# Altium footprint library connectors.PcbLib: 256 footprints (part 1 of 16)
Each footprint in its own frame and in the unit in brackets; x right, y up, seen from the top. Pads: shape width x height; smd on the part's side, far side on the other; paste and mask are expansions set on the pad; w line width, h text height; cw(c..) or ccw(c..) is an arc to the next point about the centre after c.
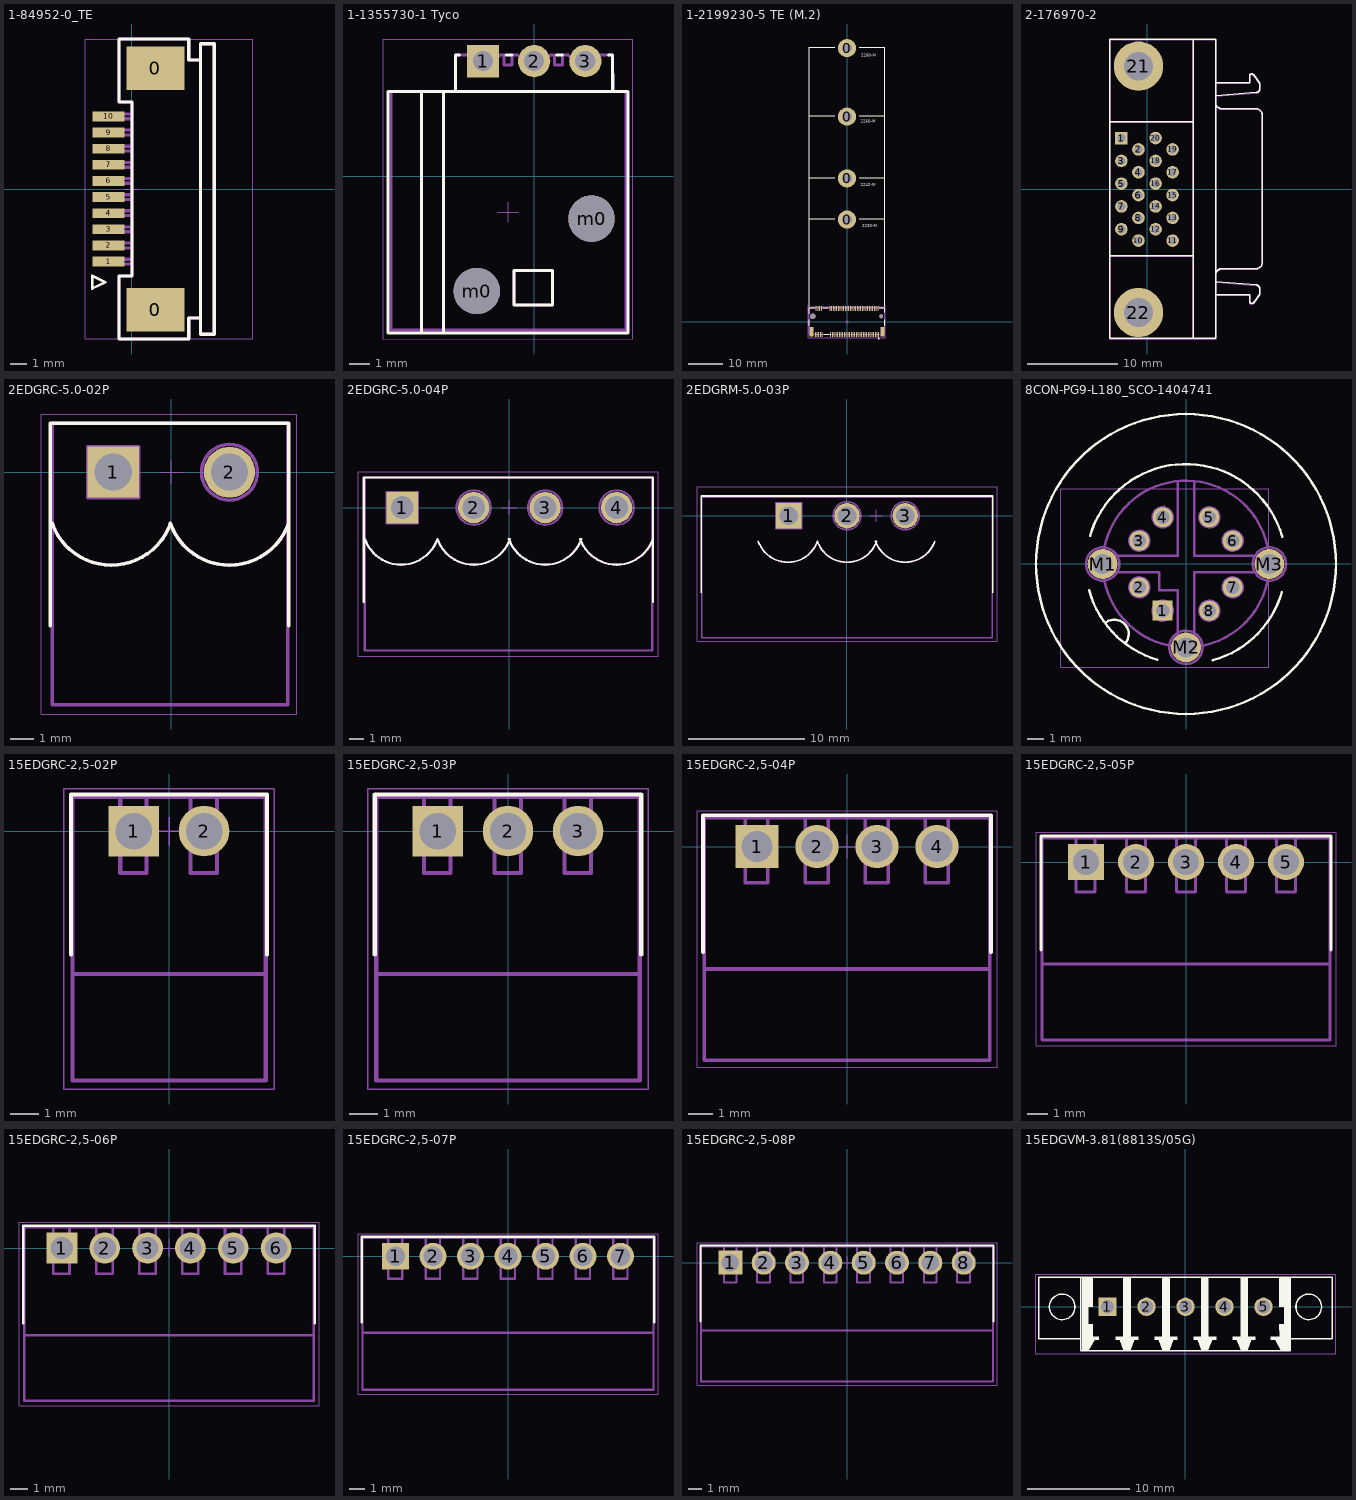
[diagram p0: the footprints below, top view; thin cyan lines are the x and y axes]

## 1-84952-0_TE [mm] "FPC_10pin_1mm_Pitch_SMD_Right Angle"
height 2.6
pads (12):
  rect 3.6x2.68 smd: 0(1.45,7.49) 0(1.45,-7.49)
  rect 2x0.61 smd: 1(-1.45,-4.5) 2(-1.45,-3.5) 3(-1.45,-2.5) 4(-1.45,-1.5) 5(-1.45,-0.5) 6(-1.45,0.5) 7(-1.45,1.5) 8(-1.45,2.5) 9(-1.45,3.5) 10(-1.45,4.5)
Top Overlay:
  lines w0.15: -2.45,-6.175 -2.45,-5.375 -1.65,-5.775 -2.45,-6.175
  lines w0.2: 3.523,-9.3 -0.799,-9.3 -0.799,-5.399 0,-5.399 0,5.399 -0.799,5.399 -0.799,9.3 3.523,9.3 3.525,9.298 3.525,8 4.25,8 ; 3.525,-9.298 3.525,-8 4.25,-8 ; 4.25,8 4.25,9 5.1,9 5.1,-9 4.25,-9 4.25,8
TopAssy 13:
  lines w0.15: -2.45,-6.175 -2.45,-5.375 -1.65,-5.775 -2.45,-6.175 ; -0.092,6.931 -0.092,8.506 2.958,8.506 2.958,6.931 -0.092,6.931 ; -0.058,-8.506 -0.058,-6.931 2.992,-6.931 2.992,-8.506 -0.058,-8.506
  lines w0.2: -0.05,-4.65 -2,-4.65 -2,-4.35 -0.05,-4.35 ; -0.05,-3.65 -2,-3.65 -2,-3.35 -0.05,-3.35 ; -0.05,-2.65 -2,-2.65 -2,-2.35 -0.05,-2.35 ; -0.05,-1.65 -2,-1.65 -2,-1.35 -0.05,-1.35 ; -0.05,-0.65 -2,-0.65 -2,-0.35 -0.05,-0.35 ; -0.05,0.35 -2,0.35 -2,0.65 -0.05,0.65 ; -0.05,1.35 -2,1.35 -2,1.65 -0.05,1.65 ; -0.05,2.35 -2,2.35 -2,2.65 -0.05,2.65 ; -0.05,3.35 -2,3.35 -2,3.65 -0.05,3.65 ; -0.05,4.35 -2,4.35 -2,4.65 -0.05,4.65 ; 3.523,-9.3 -0.799,-9.3 -0.799,-5.399 0,-5.399 0,5.399 -0.799,5.399 -0.799,9.3 3.523,9.3 3.525,9.298 3.525,8 4.25,8 ; 3.525,-9.298 3.525,-8 4.25,-8 ; 4.25,8 4.25,-9 5.1,-9 5.1,9 4.25,9 4.25,8
TopCourt 15:
  lines w0.05: -0.5,0 0.5,0 ; 0,-0.5 0,0.5 ; -2.9,-9.3 7.5,-9.3 7.5,9.3 -2.9,9.3 -2.9,-9.3
3D body "c-1-84952-0-a-3d.stp": height 2.57, standoff 0.01, extent -1.445,-8.96 5.095,8.95

## 1-1355730-1 Tyco [mm] "MW-3M (Through Hole, Right Angle Pitch  0.100\" (2.54mm)"
height 11.4
pads (5):
  rect 1.6x1.6 hole 1: 1(-2.54,5.71)
  round 1.6 hole 1: 2(0,5.71) 3(2.54,5.71)
  round 2.3 hole 2.3 unplated: m0(-2.85,-5.71) m0(2.85,-2.11)
Top Overlay:
  lines w0.15: -5.601,4.21 -5.599,-7.69 ; -4.5,-7.79 -4.5,4.21 ; -3.908,4.209 -3.896,6.01 -3.7,6.01 ; -1.4,6.01 -1.1,6.01 ; 1.1,6.01 1.4,6.01 ; 3.7,6.01 3.89,6.01 3.903,4.209 ; -7.25,-7.79 4.65,-7.79 4.65,4.21 -7.25,4.21 -7.25,-7.79 ; -1,-6.39 0.9,-6.39 0.9,-4.69 -1,-4.69 -1,-6.39
  text "." at -4,6.81 h1.52
TopAssy 13:
  circle w0.15: c-2.85,-5.71 r1.044
  circle w0.15: c2.85,-2.11 r1.044
  lines w0.15: -5.6,-7.64 -5.6,4.21 ; -4.5,-7.64 -4.5,4.21 ; -3.9,4.21 -3.9,6.01 -3.3,6.01 -2.7,5.51 ; 4.003,4.21 -7.1,4.21 -7.1,-7.64 4.55,-7.64 4.55,4.21 3.9,4.21 3.9,6.01 3.3,6.01 2.7,5.51 ; -2.7,5.51 -2.3,5.51 ; -2.7,5.51 -2.7,6.01 -2.3,6.01 -2.3,5.51 ; -2.3,5.51 -1.7,6.01 -1.5,6.01 -1.5,5.51 -1.1,5.51 -1.1,6.01 -0.8,6.01 -0.2,5.51 ; -0.2,5.51 0.2,5.51 ; -0.2,5.51 -0.2,6.01 0.2,6.01 0.2,5.51 ; 0.2,5.51 0.8,6.01 1,6.01 1,5.51 1.4,5.51 1.4,6.01 1.7,6.01 2.3,5.51 ; 2.3,5.51 2.3,6.01 2.7,6.01 2.7,5.51 ; 2.3,5.51 2.7,5.51 ; -1,-6.39 -1,-4.69 0.9,-4.69 0.9,-6.39 -1,-6.39
TopCourt 15:
  lines w0.05: -1.8,-1.79 -0.8,-1.79 ; -1.3,-2.29 -1.3,-1.29 ; -7.5,-8.09 -7.5,6.81 4.9,6.81 4.9,-8.09 -7.5,-8.09
3D body "c-1-1355730-1-d2-3d.stp": height 5.91, standoff -2.59, extent -7.1,-7.71 4.6,6.01

## 1-2199230-5 TE (M.2) [mm] "M.2 0.5PITCH 4.2H KEY M 15U'' AU"
pads (75):
  round 5.3 hole 3 unplated: 0(0,29.75) 0(0,41.75) 0(0,59.75) 0(0,79.75)
  rect 0.3x1.55 smd mask+0.05: 1(9.25,-3.775) 2(9,3.775) 3(8.75,-3.775) 4(8.5,3.775) 5(8.25,-3.775) 6(8,3.775) 7(7.75,-3.775) 8(7.5,3.775) 9(7.25,-3.775) 10(7,3.775) 11(6.75,-3.775) 12(6.5,3.775) 13(6.25,-3.775) 14(6,3.775) 15(5.75,-3.775) 16(5.5,3.775) 17(5.25,-3.775) 18(5,3.775) 19(4.75,-3.775) 20(4.5,3.775) 21(4.25,-3.775) 22(4,3.775) 23(3.75,-3.775) 24(3.5,3.775) 25(3.25,-3.775) 26(3,3.775) 27(2.75,-3.775) 28(2.5,3.775) 29(2.25,-3.775) 30(2,3.775) 31(1.75,-3.775) 32(1.5,3.775) 33(1.25,-3.775) 34(1,3.775) 35(0.75,-3.775) 36(0.5,3.775) 37(0.25,-3.775) 38(0,3.775) 39(-0.25,-3.775) 40(-0.5,3.775) 41(-0.75,-3.775) 42(-1,3.775) 43(-1.25,-3.775) 44(-1.5,3.775) 45(-1.75,-3.775) 46(-2,3.775) 47(-2.25,-3.775) 48(-2.5,3.775) 49(-2.75,-3.775) 50(-3,3.775) 51(-3.25,-3.775) 52(-3.5,3.775) 53(-3.75,-3.775) 54(-4,3.775) 55(-4.25,-3.775) 56(-4.5,3.775) 57(-4.75,-3.775) 58(-5,3.775) 67(-7.25,-3.775) 68(-7.5,3.775) 69(-7.75,-3.775) 70(-8,3.775) 71(-8.25,-3.775) 72(-8.5,3.775) 73(-8.75,-3.775) 74(-9,3.775) 75(-9.25,-3.775)
  round 1.6 hole 1.6 unplated: None(-10,1.5)
  round 1.1 hole 1.1 unplated: None(10,1.5)
  rect 1.2x2.75 smd: S1(10.35,-3) S2(-10.35,-3)
Top Overlay:
  circle w0.2: c9.25,-5 r0.1
  lines w0.127: -10.95,-1.3 -10.95,0.45 ; -10.95,2.3 -10.95,4 -9.45,4 ; -7.1,4 -5.4,4 ; -6.8,-3.75 -5.2,-3.75 ; 9.4,4 10.95,4 10.95,2.7 ; 10.95,-1.3 10.95,0.55
  lines w0.15: -11,4.5 -11,60 ; -11,30 -3.5,30 ; -11,42 -3.5,42 ; -3.5,60 -11,60 ; -3.5,80 -11,80 -11,60 ; 3.5,30 11,30 ; 3.5,42 11,42 ; 3.5,60 11,60 ; 3.5,80 11,80 11,60 ; 11,4.5 11,60
  text "2280-M" at 4.1,77.2 h0.85
  text "2230-M" at 4.5,27.5 h0.85
  text "2242-M" at 4,39.5 h0.85
  text "2260-M" at 4,58 h0.85
TopAssy 13:
  lines w0.127: -10.95,-3.75 -10.95,4 ; -10.95,-3.75 10.95,-3.75 ; -10.95,-3.75 -10.95,4 ; -10.95,-3.75 10.95,-3.75 ; -10.95,4 10.95,4 ; -10.95,4 10.95,4 ; 10.95,-3.75 10.95,4 ; 10.95,-3.75 10.95,4
TopCourt 15:
  lines w0.05: -11.25,4.3 11.2,4.3 ; -11.25,4.8 -11.25,-4.8 11.2,-4.8 11.2,4.8 ; -0.5,0 0.5,0 ; 0,-0.5 0,0.5
3D body "9774025243R.stp": height 2.51, standoff -1.39, extent -2.175,77.576 2.175,81.925
3D body "c-1-2199230-5-b2-3d.stp": height 4.06, standoff -0.64, extent -10.95,-4.35 10.95,4.35

## 2-176970-2 [mm] "Connector; CHAMP Miniature Ribbon 050 Series II; 20 Position; Right Angle"
height 9.6
pads (22):
  rect 1.4x1.4 hole 0.9: 1(-2.857,5.715)
  round 1.4 hole 0.9: 2(-0.953,4.445) 3(-2.858,3.175) 4(-0.953,1.905) 5(-2.857,0.635) 6(-0.953,-0.635) 7(-2.857,-1.905) 8(-0.953,-3.175) 9(-2.857,-4.445) 10(-0.953,-5.715) 11(2.857,-5.715) 12(0.953,-4.445) 13(2.858,-3.175) 14(0.953,-1.905) 15(2.857,-0.635) 16(0.953,0.635) 17(2.857,1.905) 18(0.953,3.175) 19(2.857,4.445) 20(0.953,5.715)
  round 5.5 hole 3.2: 21(-0.953,13.725) 22(-0.953,-13.725)
Top Overlay:
  lines w0.15: -4.157,-7.4 5.142,-7.4 ; -4.157,7.55 5.062,7.55 ; 5.142,-16.6 5.142,16.75 ; 7.642,-11.745 11.432,-11.745 11.433,-12.625 ccw(c11.652,-12.375) 11.897,-12.601 ; 7.642,-10.275 12.163,-10.645 ; 7.642,10.425 12.163,10.795 ; 7.642,11.895 11.432,11.895 11.433,12.775 cw(c11.652,12.525) 11.897,12.751 ; 7.648,-9.535 cw(c8.343,-9.535) 8.343,-8.84 12.143,-8.84 ; 7.648,9.685 ccw(c8.343,9.685) 8.343,8.99 12.143,8.99 ; 11.912,-12.615 12.54,-11.675 12.54,-10.953 ccw(c12.143,-11.055) 12.143,-10.645 ; 11.912,12.765 12.54,11.825 12.54,11.103 cw(c12.143,11.205) 12.143,10.795 ; 12.148,-8.835 ccw(c12.148,-8.14) 12.843,-8.14 12.842,8.29 ccw(c12.148,8.29) 12.148,8.985 ; -4.157,-16.6 7.642,-16.6 7.642,16.75 -4.157,16.75 -4.157,-16.6
Bottom3D 2:
  text "11" at 5.617,-4.84 h1.5
  text "20" at 5.617,6.965 h1.5
  text "10" at -6.132,-4.59 h1.5
  text "1" at -6.132,5.965 h1.5
TopAssy 13:
  circle w0.15: c-0.953,13.7 r1.65
  circle w0.15: c-0.953,-13.75 r1.65
  lines w0.15: -4.157,-7.475 5.142,-7.475 ; -4.157,7.475 5.062,7.475 ; 5.142,-16.675 5.142,16.675 ; 7.642,-11.82 11.432,-11.82 11.433,-12.7 ccw(c11.652,-12.45) 11.897,-12.676 ; 7.642,-10.35 12.163,-10.72 ; 7.642,10.35 12.163,10.72 ; 7.642,11.82 11.432,11.82 11.433,12.7 cw(c11.652,12.45) 11.897,12.676 ; 7.648,-9.61 cw(c8.343,-9.61) 8.343,-8.915 12.143,-8.915 ; 7.648,9.61 ccw(c8.343,9.61) 8.343,8.915 12.143,8.915 ; 11.912,-12.69 12.54,-11.75 12.54,-11.028 ccw(c12.143,-11.13) 12.143,-10.72 ; 11.912,12.69 12.54,11.75 12.54,11.028 cw(c12.143,11.13) 12.143,10.72 ; 12.148,-8.91 ccw(c12.148,-8.215) 12.843,-8.215 12.842,8.215 ccw(c12.148,8.215) 12.148,8.91 ; -4.157,-16.675 -4.157,16.675 7.642,16.675 7.642,-16.675 -4.157,-16.675

## 2EDGRC-5.0-02P [mm] "Разъем на плату, шаг 5.0, вилка 2EDGRC-5.0-02P"
height 12
pads (2):
  rect 2.2x2.2 hole 1.6: 1(-2.5,0)
  round 2.2 hole 1.6: 2(2.5,0)
Top Overlay:
  lines w0.15: -5.2,-6.6 -5.2,2.1 5.04,2.1 5.04,-6.6 ; -5.125,-2.202 ccw(c-2.58,-1.3) -0.036,-2.205 ; -0.045,-2.202 ccw(c2.5,-1.3) 5.045,-2.202
  text "." at -2.58,2.395 h1.52
TopAssy 13:
  circle w0.15: c2.5,0 r1.2
  lines w0.15: -5.125,-2.202 ccw(c-2.58,-1.3) -0.036,-2.205 ; -0.045,-2.202 ccw(c2.5,-1.3) 5,-2.32 ; -5.125,-10 5,-10 5,2.1 -5.125,2.1 -5.125,-10 ; -3.6,-1.1 -1.4,-1.1 -1.4,1.1 -3.6,1.1 -3.6,-1.1
  text "." at -2.58,2.395 h1.52
TopCourt 15:
  lines w0.05: -0.5,-0.001 0.5,-0.001 ; 0,-0.501 0,0.499 ; -5.6,-10.4 -5.6,2.5 5.4,2.5 5.4,-10.4 -5.6,-10.4
3D body "2EDGRC-5.08-02P-14-00AH_.step": height 8.25, standoff -3.95, extent -5.12,-10 5.04,2.1

## 2EDGRC-5.0-04P [mm] "Разъем на плату, шаг 5.0, вилка 2EDGRC-5.0-04P"
height 12
pads (4):
  rect 2.2x2.2 hole 1.6: 1(-7.5,0)
  round 2.2 hole 1.6: 2(-2.5,0) 3(2.5,0) 4(7.5,0)
Top Overlay:
  lines w0.15: -10.2,-6.6 -10.2,2.1 10.04,2.1 10.04,-6.6 ; -10.125,-2.202 ccw(c-7.58,-1.3) -5.036,-2.205 ; -5.045,-2.202 ccw(c-2.5,-1.3) 0.045,-2.202 ; -0.045,-2.202 ccw(c2.5,-1.3) 5.045,-2.202 ; 4.955,-2.202 ccw(c7.5,-1.3) 10.045,-2.202
  text "." at -7.58,2.395 h1.52
TopAssy 13:
  circle w0.15: c7.5,0 r1.2
  circle w0.15: c2.5,0 r1.2
  circle w0.15: c-2.5,0 r1.2
  lines w0.15: -10.125,-2.202 ccw(c-7.58,-1.3) -5.036,-2.205 ; -5.045,-2.202 ccw(c-2.5,-1.3) 0,-2.32 ; -0.045,-2.202 ccw(c2.5,-1.3) 5,-2.32 ; 4.955,-2.202 ccw(c7.5,-1.3) 10,-2.32 ; -10.125,-10 -10.125,2.1 10,2.1 10,-10 -10.125,-10 ; -8.6,-1.1 -8.6,1.1 -6.4,1.1 -6.4,-1.1 -8.6,-1.1
  text "." at -7.58,2.395 h1.52
TopCourt 15:
  lines w0.05: -0.5,-0.001 0.5,-0.001 ; 0,-0.501 0,0.499 ; -10.6,-10.4 10.4,-10.4 10.4,2.5 -10.6,2.5 -10.6,-10.4
3D body "2EDGRC-5.08-02P-14-00AH_.step": height 8.25, standoff -3.95, extent -10.12,-10 0.04,2.1
3D body "2EDGRC-5.08-02P-14-00AH_.step": height 8.25, standoff -3.95, extent -0.12,-10 10.04,2.1

## 2EDGRM-5.0-03P [mm] "Разъем на плату 3 контакта, шаг 5.0, вилка 2EDGRM-5.0-03P-14-00A(H)"
height 8.2
pads (3):
  rect 2.2x2.2 hole 1.6: 1(-5,0)
  round 2.2 hole 1.6: 2(0,0) 3(5,0)
Top Overlay:
  lines w0.15: -12.54,-6.6 -12.54,1.691 12.54,1.691 12.54,-6.6 ; -7.625,-2.202 ccw(c-5.08,-1.3) -2.536,-2.205 ; -2.545,-2.202 ccw(c0,-1.3) 2.545,-2.202 ; 2.455,-2.202 ccw(c5,-1.3) 7.545,-2.202
  text "." at -5.08,2.395 h1.52
TopAssy 13:
  circle w0.15: c0,0 r1.2
  circle w0.15: c5,0 r1.2
  lines w0.15: -7.625,-2.202 ccw(c-5.08,-1.3) -2.536,-2.205 ; -2.545,-2.202 ccw(c0,-1.3) 2.5,-2.32 ; 2.455,-2.202 ccw(c5,-1.3) 7.5,-2.32 ; -12.5,-10.5 12.5,-10.5 12.5,1.6 -12.5,1.6 -12.5,-10.5 ; -6.1,-1.1 -3.9,-1.1 -3.9,1.1 -6.1,1.1 -6.1,-1.1
  text "." at -5.08,2.395 h1.52
TopCourt 15:
  lines w0.05: 2,-0.001 3,-0.001 ; 2.5,-0.501 2.5,0.499 ; -12.9,-10.8 -12.9,2.5 12.9,2.5 12.9,-10.8 -12.9,-10.8
3D body "2EDGRM-5.0-03P-14-00AH.STEP": height 8.25, standoff -3.95, extent -12.5,-10.5 12.5,1.6

## 8CON-PG9-L180_SCO-1404741 [mm] "Разъем на плату, вилка 8 контактов 10Gbit"
height 23
pads (11):
  rect 1.2x1.2 hole 0.8: 1(-1.4,-2.8)
  round 1.2 hole 0.8: 2(-2.8,-1.4) 3(-2.8,1.4) 4(-1.4,2.8) 5(1.4,2.8) 6(2.8,1.4) 7(2.8,-1.4) 8(1.4,-2.8)
  round 1.8 hole 1.2: M1(-5,0) M2(0,-5) M3(5,0)
Top Overlay:
  circle w0.15: c0,0 r9
  lines w0.15: -5.816,-1.583 ccw(c-0.033,0.017) -1.718,-5.742 ; -5.758,1.685 cw(c0,0) 5.77,1.644 ; -4.777,-3.484 cw(c-4.3,-4.2) -3.647,-4.76 ; 1.6,-5.783 ccw(c0,0) 5.758,-1.686
  text "." at -2.5,-4 h1.52
TopAssy 13:
  circle w0.15: c-1.4,-2.8 r0.6
  circle w0.15: c0,-5 r1
  circle w0.15: c-5,0 r1
  circle w0.15: c5,0 r1
  circle w0.15: c-2.8,1.4 r0.6
  circle w0.15: c-2.8,-1.4 r0.6
  circle w0.15: c1.4,-2.8 r0.6
  circle w0.15: c2.8,-1.4 r0.6
  circle w0.15: c2.8,1.4 r0.6
  circle w0.15: c1.4,2.8 r0.6
  circle w0.15: c-1.4,2.8 r0.6
  circle w0.15: c0,0 r5
  lines w0.15: -4.97,-0.5 -1.606,-0.5 -1.606,-1.583 -0.5,-1.583 -0.5,-4.97 ; -4.97,0.5 -0.5,0.5 -0.5,4.97 ; 0.5,-4.97 0.5,-0.5 4.969,-0.5 ; 0.5,4.97 0.5,0.5 4.969,0.5
TopCourt 15:
  lines w0.05: -1.78,3.018 -0.78,3.018 ; -1.28,2.518 -1.28,3.518 ; -7.53,-6.182 4.97,-6.182 4.97,4.518 -7.53,4.518 -7.53,-6.182
3D body "1404741.stp": height 22.46, standoff -2.39, extent -9,-9.997 9,9.997

## 15EDGRC-2,5-02P [mm] "Разъем на плату, вилка DAGSON угловая"
height 9.2
pads (2):
  rect 1.8x1.8 hole 1.3: 1(-1.25,0)
  round 1.8 hole 1.3: 2(1.25,0)
Top Overlay:
  lines w0.15: -3.5,-4.4 -3.5,1.3 3.5,1.3 3.5,-4.4
  text "." at -2.7,1.9 h1.52
TopAssy 13:
  circle w0.15: c1.25,0 r0.6
  circle w0.15: c-1.25,0 r0.6
  lines w0.15: -3.446,-5.1 3.448,-5.1 ; -2,1.212 -1.741,1.212 -1.741,-1.5 -0.803,-1.5 -0.803,1.212 ; 0.766,1.212 0.766,-1.5 1.715,-1.5 1.715,1.212 ; -3.446,-8.9 3.448,-8.9 3.448,1.212 -3.446,1.212 -3.446,-8.9
TopCourt 15:
  lines w0.05: -0.5,0 0.5,0 ; 0,-0.5 0,0.5 ; -3.75,-9.2 -3.75,1.5 3.75,1.5 3.75,-9.2 -3.75,-9.2
3D body "User Library-15EDGRC-2_5-02P-1Y-00A (H).step": height 8.15, standoff -3.75, extent -3.45,-8.9 3.45,1.2

## 15EDGRC-2,5-03P [mm] "Разъем на плату, вилка DAGSON угловая"
height 9.2
pads (3):
  rect 1.8x1.8 hole 1.3: 1(-2.5,0)
  round 1.8 hole 1.3: 2(0,0) 3(2.5,0)
Top Overlay:
  lines w0.15: -4.75,-4.4 -4.75,1.3 4.75,1.3 4.75,-4.4
  text "." at -3.95,1.9 h1.52
TopAssy 13:
  circle w0.15: c0,0 r0.6
  circle w0.15: c-2.5,0 r0.6
  circle w0.15: c2.5,0 r0.6
  lines w0.15: -4.696,-5.1 4.698,-5.1 ; -3.25,1.212 -2.991,1.212 -2.991,-1.5 -2.053,-1.5 -2.053,1.212 ; -0.484,1.212 -0.484,-1.5 0.465,-1.5 0.465,1.212 ; 2.016,1.212 2.016,-1.5 2.965,-1.5 2.965,1.212 ; -4.696,-8.9 4.698,-8.9 4.698,1.212 -4.696,1.212 -4.696,-8.9
TopCourt 15:
  lines w0.05: -0.5,0 0.5,0 ; 0,-0.5 0,0.5 ; -5,-9.2 -5,1.5 5,1.5 5,-9.2 -5,-9.2
3D body "User Library-15EDGRC-2_5-03P-1Y-00A (H).step": height 8.15, standoff -3.75, extent -4.7,-8.9 4.7,1.2

## 15EDGRC-2,5-04P [mm] "Разъем на плату, вилка DAGSON угловая"
height 9.2
pads (4):
  rect 1.8x1.8 hole 1.3: 1(-3.75,0)
  round 1.8 hole 1.3: 2(-1.25,0) 3(1.25,0) 4(3.75,0)
Top Overlay:
  lines w0.15: -6,-4.4 -6,1.3 6,1.3 6,-4.4
  text "." at -5.2,1.9 h1.52
TopAssy 13:
  circle w0.15: c-3.75,0 r0.6
  circle w0.15: c-1.25,0 r0.6
  circle w0.15: c1.25,0 r0.6
  circle w0.15: c3.75,0 r0.6
  lines w0.15: -5.946,-5.1 5.948,-5.1 ; -4.5,1.212 -4.241,1.212 -4.241,-1.5 -3.303,-1.5 -3.303,1.212 ; -1.734,1.212 -1.734,-1.5 -0.785,-1.5 -0.785,1.212 ; 0.766,1.212 0.766,-1.5 1.715,-1.5 1.715,1.212 ; 3.266,1.212 3.266,-1.5 4.215,-1.5 4.215,1.212 ; 5.948,-8.9 5.948,1.212 -5.946,1.212 -5.946,-8.9 5.95,-8.9
TopCourt 15:
  lines w0.05: -0.5,0 0.5,0 ; 0,-0.5 0,0.5 ; -6.25,-9.2 6.25,-9.2 6.25,1.5 -6.25,1.5 -6.25,-9.2
3D body "User Library-15EDGRC-2_5-04P-1Y-00A (H).step": height 8.15, standoff -3.75, extent -5.95,-8.9 5.95,1.2

## 15EDGRC-2,5-05P [mm] "Разъем на плату, вилка DAGSON угловая"
height 9.2
pads (5):
  rect 1.8x1.8 hole 1.3: 1(-5,0)
  round 1.8 hole 1.3: 2(-2.5,0) 3(0,0) 4(2.5,0) 5(5,0)
Top Overlay:
  lines w0.15: -7.25,-4.4 -7.25,1.3 7.25,1.3 7.25,-4.4
  text "." at -6.45,1.9 h1.52
TopAssy 13:
  circle w0.15: c-2.5,0 r0.6
  circle w0.15: c-5,0 r0.6
  circle w0.15: c0,0 r0.6
  circle w0.15: c2.5,0 r0.6
  circle w0.15: c5,0 r0.6
  lines w0.15: -7.196,-5.1 7.2,-5.1 ; -5.75,1.212 -5.491,1.212 -5.491,-1.5 -4.553,-1.5 -4.553,1.212 ; -2.984,1.212 -2.984,-1.5 -2.035,-1.5 -2.035,1.212 ; -0.484,1.212 -0.484,-1.5 0.465,-1.5 0.465,1.212 ; 2.016,1.212 2.016,-1.5 2.965,-1.5 2.965,1.212 ; 4.516,1.212 4.516,-1.5 5.465,-1.5 5.465,1.212 ; -7.196,-8.9 7.198,-8.9 7.198,1.212 -7.196,1.212 -7.196,-8.9
TopCourt 15:
  lines w0.05: -0.5,0 0.5,0 ; 7.5,-0.5 7.5,0.5 ; -7.5,-9.2 -7.5,1.5 7.5,1.5 7.5,-9.2 -7.5,-9.2
3D body "User Library-15EDGRC-2_5-05P-1Y-00A (H).step": height 8.15, standoff -3.75, extent -7.2,-8.9 7.2,1.2

## 15EDGRC-2,5-06P [mm] "Разъем на плату, вилка DAGSON угловая"
height 9.2
pads (6):
  rect 1.8x1.8 hole 1.3: 1(-6.25,0)
  round 1.8 hole 1.3: 2(-3.75,0) 3(-1.25,0) 4(1.25,0) 5(3.75,0) 6(6.25,0)
Top Overlay:
  lines w0.15: -8.5,-4.4 -8.5,1.3 8.5,1.3 8.5,-4.4
  text "." at -7.7,1.9 h1.52
TopAssy 13:
  circle w0.15: c6.25,0 r0.6
  circle w0.15: c3.75,0 r0.6
  circle w0.15: c1.25,0 r0.6
  circle w0.15: c-1.25,0 r0.6
  circle w0.15: c-6.25,0 r0.6
  circle w0.15: c-3.75,0 r0.6
  lines w0.15: -8.446,-5.1 8.448,-5.1 ; -7,1.212 -6.741,1.212 -6.741,-1.5 -5.803,-1.5 -5.803,1.212 ; -4.234,1.212 -4.234,-1.5 -3.285,-1.5 -3.285,1.212 ; -1.734,1.212 -1.734,-1.5 -0.785,-1.5 -0.785,1.212 ; 0.766,1.212 0.766,-1.5 1.715,-1.5 1.715,1.212 ; 3.266,1.212 3.266,-1.5 4.215,-1.5 4.215,1.212 ; 5.766,1.212 5.766,-1.5 6.715,-1.5 6.715,1.212 ; 8.448,1.212 8.448,-8.9 -8.446,-8.9 -8.446,1.212 8.45,1.212
TopCourt 15:
  lines w0.05: -0.5,0 0.5,0 ; 0,-0.5 0,0.5 ; 8.75,-0.5 8.75,0.5 ; -8.75,-9.2 8.75,-9.2 8.75,1.5 -8.75,1.5 -8.75,-9.2
3D body "User Library-15EDGRC-2_5-06P-1Y-00A (H).step": height 8.15, standoff -3.75, extent -8.45,-8.9 8.45,1.2

## 15EDGRC-2,5-07P [mm] "Разъем на плату, вилка DAGSON угловая"
height 9.2
pads (7):
  rect 1.8x1.8 hole 1.3: 1(-7.5,0)
  round 1.8 hole 1.3: 2(-5,0) 3(-2.5,0) 4(0,0) 5(2.5,0) 6(5,0) 7(7.5,0)
Top Overlay:
  lines w0.15: -9.75,-4.4 -9.75,1.3 9.75,1.3 9.75,-4.4
  text "." at -8.95,1.9 h1.52
TopAssy 13:
  circle w0.15: c7.5,0 r0.6
  circle w0.15: c5,0 r0.6
  circle w0.15: c2.5,0 r0.6
  circle w0.15: c0,0 r0.6
  circle w0.15: c-2.5,0 r0.6
  circle w0.15: c-5,0 r0.6
  circle w0.15: c-7.5,0 r0.6
  lines w0.15: -9.696,-5.1 9.7,-5.1 ; -8.25,1.212 -7.991,1.212 -7.991,-1.5 -7.053,-1.5 -7.053,1.212 ; -5.484,1.212 -5.484,-1.5 -4.535,-1.5 -4.535,1.212 ; -2.984,1.212 -2.984,-1.5 -2.035,-1.5 -2.035,1.212 ; -0.484,1.212 -0.484,-1.5 0.465,-1.5 0.465,1.212 ; 2.016,1.212 2.016,-1.5 2.965,-1.5 2.965,1.212 ; 4.516,1.212 4.516,-1.5 5.465,-1.5 5.465,1.212 ; 7.016,1.212 7.016,-1.5 7.965,-1.5 7.965,1.212 ; 9.698,1.212 9.698,-8.9 -9.696,-8.9 -9.696,1.212 9.7,1.212
TopCourt 15:
  lines w0.05: -0.5,0 0.5,0 ; 0,-0.5 0,0.5 ; 10,-0.5 10,0.5 ; -10,-9.2 -10,1.5 10,1.5 10,-9.2 -10,-9.2
3D body "User Library-15EDGRC-2_5-07P-1Y-00A (H).step": height 8.15, standoff -3.75, extent -9.7,-8.9 9.7,1.2

## 15EDGRC-2,5-08P [mm] "Разъем на плату, вилка DAGSON угловая"
height 9.2
pads (8):
  rect 1.8x1.8 hole 1.3: 1(-8.75,0)
  round 1.8 hole 1.3: 2(-6.25,0) 3(-3.75,0) 4(-1.25,0) 5(1.25,0) 6(3.75,0) 7(6.25,0) 8(8.75,0)
Top Overlay:
  lines w0.15: -11,-4.4 -11,1.3 11,1.3 11,-4.4
  text "." at -10.2,1.9 h1.52
TopAssy 13:
  circle w0.15: c8.75,0 r0.6
  circle w0.15: c6.25,0 r0.6
  circle w0.15: c3.75,0 r0.6
  circle w0.15: c1.25,0 r0.6
  circle w0.15: c-1.25,0 r0.6
  circle w0.15: c-3.75,0 r0.6
  circle w0.15: c-6.25,0 r0.6
  circle w0.15: c-8.75,0 r0.6
  lines w0.15: -10.946,-5.1 10.948,-5.1 ; -9.5,1.212 -9.241,1.212 -9.241,-1.5 -8.303,-1.5 -8.303,1.212 ; -6.734,1.212 -6.734,-1.5 -5.785,-1.5 -5.785,1.212 ; -4.234,1.212 -4.234,-1.5 -3.285,-1.5 -3.285,1.212 ; -1.734,1.212 -1.734,-1.5 -0.785,-1.5 -0.785,1.212 ; 0.766,1.212 0.766,-1.5 1.715,-1.5 1.715,1.212 ; 3.266,1.212 3.266,-1.5 4.215,-1.5 4.215,1.212 ; 5.766,1.212 5.766,-1.5 6.715,-1.5 6.715,1.212 ; 8.266,1.212 8.266,-1.5 9.215,-1.5 9.215,1.212 ; -10.946,-8.9 10.948,-8.9 10.948,1.212 -10.946,1.212 -10.946,-8.9
TopCourt 15:
  lines w0.05: -0.5,0 0.5,0 ; 0,-0.5 0,0.5 ; -11.25,-9.2 -11.25,1.5 11.25,1.5 11.25,-9.2 -11.25,-9.2
3D body "User Library-15EDGRC-2_5-08P-1Y-00A (H).step": height 8.15, standoff -3.75, extent -10.95,-8.9 10.95,1.2

## 15EDGVM-3.81(8813S/05G) [mm] "Разъем на плату, вилка Degson"
height 9.2
pads (5):
  rect 1.8x1.8 hole 1.3: 1(-7.62,0)
  round 1.8 hole 1.3: 2(-3.81,0) 3(0,0) 4(3.81,0) 5(7.62,0)
Top Overlay:
  circle w0.15: c-12.04,0 r1.25
  circle w0.15: c12.039,0 r1.25
  region: 5.38,2.8 5.38,-2.9 6.08,-2.9 6.08,2.8
  region: 5.43,-4.3 5.03,-3.2 4.63,-3.2 4.63,-2.9 6.83,-2.9 6.83,-3.2 6.43,-3.2 6.03,-4.3
  region: -6.01,-4.3 -6.41,-3.2 -6.81,-3.2 -6.81,-2.9 -4.61,-2.9 -4.61,-3.2 -5.01,-3.2 -5.41,-4.3
  region: -2.21,-4.3 -2.61,-3.2 -3.01,-3.2 -3.01,-2.9 -0.81,-2.9 -0.81,-3.2 -1.21,-3.2 -1.61,-4.3
  region: 1.59,-4.3 1.19,-3.2 0.79,-3.2 0.79,-2.9 2.99,-2.9 2.99,-3.2 2.59,-3.2 2.19,-4.3
  region: -6.06,2.8 -6.06,-2.9 -5.36,-2.9 -5.36,2.8
  region: -2.26,2.8 -2.26,-2.9 -1.56,-2.9 -1.56,2.8
  region: 1.54,2.8 1.54,-2.9 2.24,-2.9 2.24,2.8
  region: -9.06,2.8 -9.06,0 -9.51,0 -9.51,-1.7 -9.06,-1.7 -9.06,-2.9 -8.46,-2.9 -8.46,-3.2 -8.86,-3.2 -9.51,-4.3 -10.085,-4.3 -10.085,2.8
  region: 9.165,2.8 9.165,0 9.64,0 9.64,-1.7 9.165,-1.7 9.19,-2.9 8.34,-2.9 8.34,-3.2 8.765,-3.2 9.34,-4.3 10.14,-4.3 10.14,2.8
  lines w0.15: -10.21,-3.1 -14.351,-3.1 -14.351,2.9 -8.534,2.9 ; 10.23,-3.1 14.351,-3.1 14.351,2.9 10.23,2.9 ; 10.23,2.9 10.23,-4.3 -10.21,-4.3 -10.21,2.9 10.23,2.9
TopAssy 13:
TopCourt 15:
  lines w0.05: -0.5,0 0.5,0 ; 0,-0.5 0,0.5 ; -14.6,-4.6 14.7,-4.6 14.7,3.2 -14.6,3.2 -14.6,-4.6